# Altium footprint library 2.52-直插元件.PcbLib: 163 footprints (part 4 of 11)
Each footprint in its own frame and in the unit in brackets; x right, y up, seen from the top. Pads: shape width x height; smd on the part's side, far side on the other; paste and mask are expansions set on the pad; w line width, h text height; cw(c..) or ccw(c..) is an arc to the next point about the centre after c.
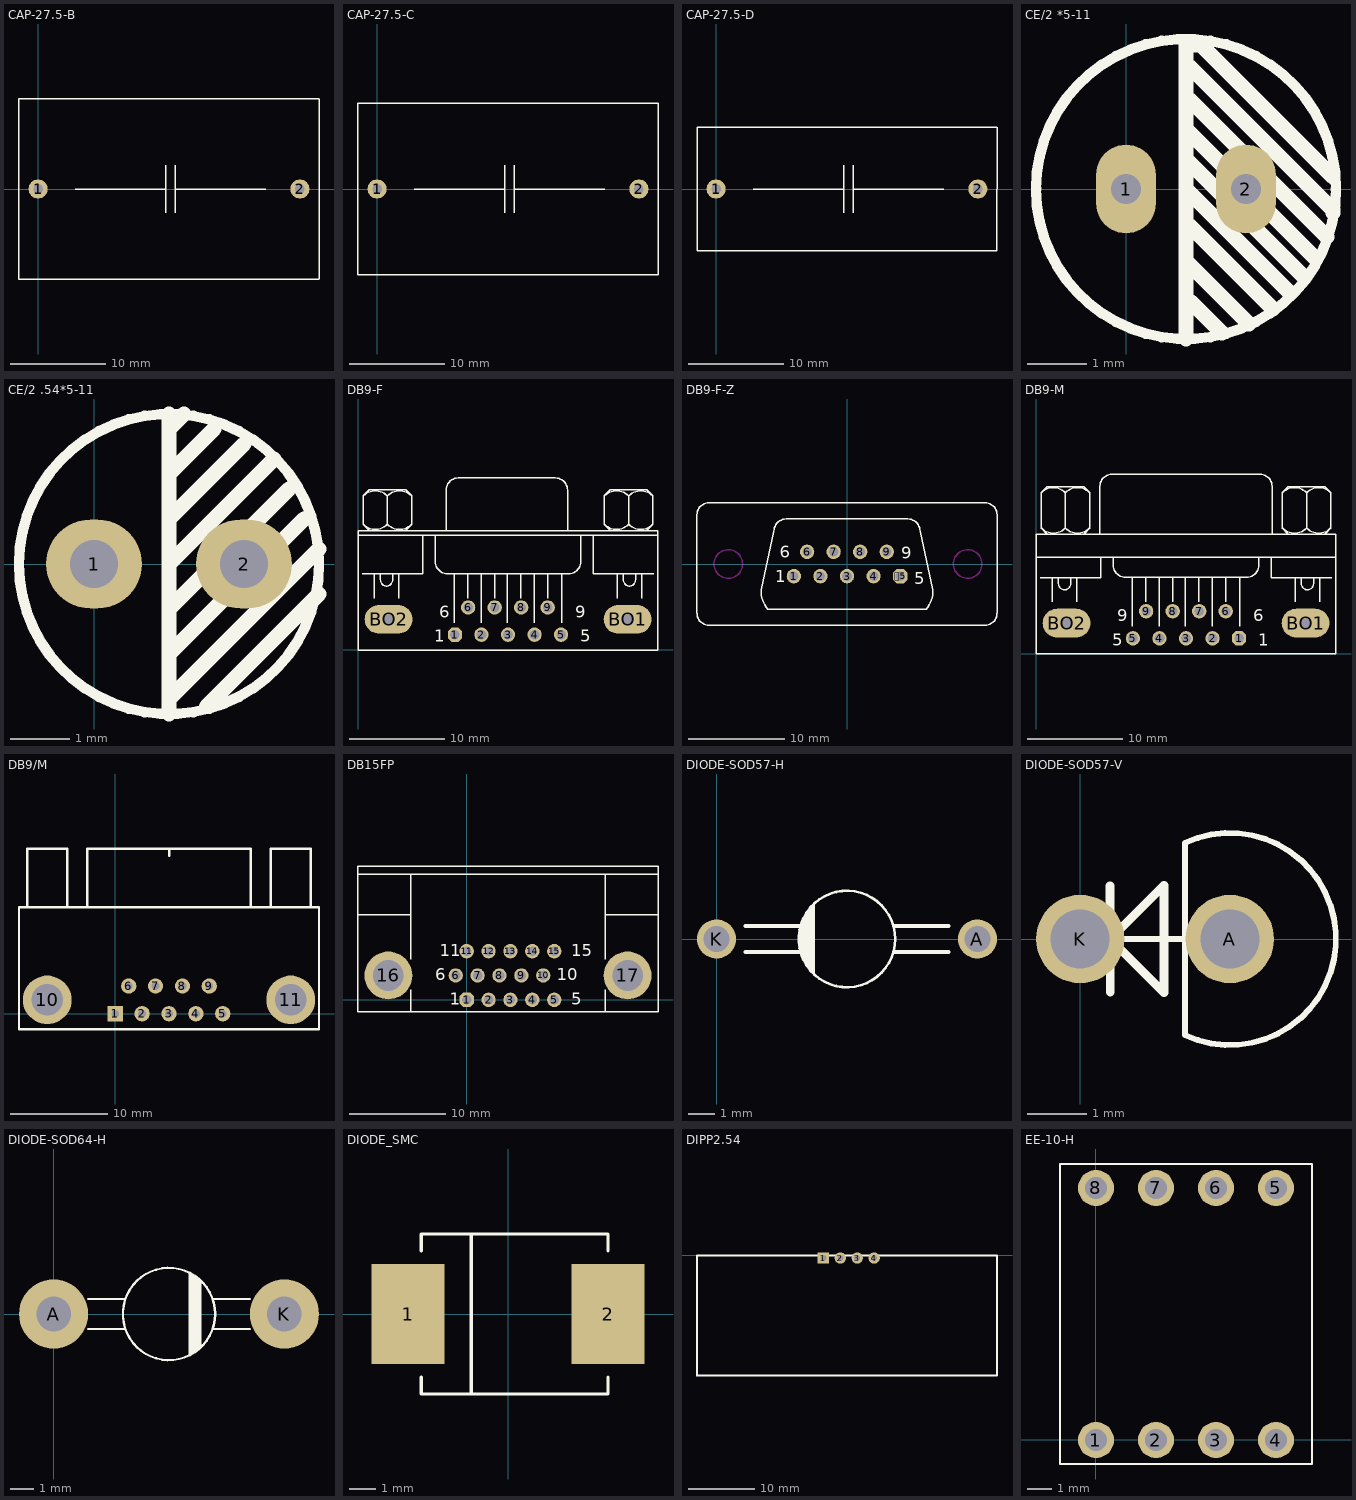
[diagram p3: the footprints below, top view; thin cyan lines are the x and y axes]

## CAP-27.5-B [mm]
pads (2):
  round 2 hole 1: 1(0,0) 2(27.5,0)
Top Overlay:
  lines w0.15: 3.901,0 13.401,0 ; 13.401,-2.5 13.401,2.5 ; 14.401,-2.5 14.401,2.5 ; 14.401,0 23.901,0 ; 29.487,-9.5 -2,-9.5 -2,9.5 29.5,9.5 29.5,-9.5
3D body "User Library-B81131(19_30_31).step": height 30, standoff -1.5, extent -2,-9.5 29.5,9.5

## CAP-27.5-C [mm]
pads (2):
  round 2 hole 1: 1(0,0) 2(27.5,0)
Top Overlay:
  lines w0.15: 3.901,0 13.401,0 ; 13.401,-2.5 13.401,2.5 ; 14.401,-2.5 14.401,2.5 ; 14.401,0 23.901,0 ; -2,-9 -2,9 29.5,9 29.5,-9 -2,-9
3D body "User Library-B32924F3565.step": height 1.5, standoff -33, extent -2,-9 29.5,9

## CAP-27.5-D [mm] "淘宝ID:黄晶宝石   店铺网址:https://shop463601444.taobao.com"
pads (2):
  round 2 hole 1: 1(0,0) 2(27.5,0)
Top Overlay:
  lines w0.15: 3.901,0 13.401,0 ; 13.401,-2.5 13.401,2.5 ; 14.401,-2.5 14.401,2.5 ; 14.401,0 23.901,0 ; 29.5,6.5 -2,6.5 -2,-6.5 29.5,-6.5 29.505,6.5
3D body "CAP-27.5.STEP": height 1.05, standoff -22.45, extent -2,-6.5 29.5,6.5

## CE/2 *5-11 [mil]
pads (2):
  oval 40x59.06 hole 20: 1(0,0) 2(80,0)
Top Overlay:
  circle w7: c40,0 r100
  lines w10: 40,-100 40,96 ; 40,0 109,-69 ; 40,20 118,-58 ; 40,40 126,-46 ; 41,-49 82,-90 ; 42,-24 98,-80 ; 42,60 134,-32 ; 42,82 138,-14 138,-16 ; 43,-75 64,-96 ; 44,96 50,96 138,8
3D body "SW3DPS-ELECTROLITIC CAPACITOR RADIAL 5X11-DEFAULT.STEP": height 433.07, standoff -98.43, extent -58,-98 138.85,98.85

## CE/2 .54*5-11 [mil]
pads (2):
  oval 64x59.06 hole 32: 1(0,0) 2(100,0)
Top Overlay:
  circle w7: c50,0 r100
  lines w10: 50,-100 50,100 ; 50,-90 150,10 ; 50,-60 140,30 ; 50,-30 130,50 ; 50,0 120,70 ; 50,30 100,80 ; 50,60 80,90 ; 50,90 60,100 ; 75,-95 150,-20
3D body "SW3DPS-ELECTROLITIC CAPACITOR RADIAL 5X11-DEFAULT.STEP": height 433.07, standoff -98.43, extent -48,-98 148.85,98.85

## DB9-F [mm]
pads (11):
  oct 1.5x1.5 hole 1: 1(10.092,1.6)
  round 1.5 hole 1: 2(12.865,1.6) 3(15.638,1.6) 4(18.411,1.6) 5(21.184,1.6) 6(11.468,4.44) 7(14.241,4.44) 8(17.014,4.44) 9(19.787,4.44)
  oval 5x3 hole 1: BO1(28.147,3.2) BO2(3.15,3.2)
Top Overlay:
  lines w0.15: -0.025,11.975 31.301,11.975 ; 0.398,7.95 6.748,7.95 6.748,11.975 ; 0.48,13.138 ccw(c1.753,14.41) 3.025,13.138 ; 0.48,16.106 cw(c1.753,14.834) 3.025,16.106 ; 1.118,12.505 0.483,13.14 0.483,16.104 1.118,16.739 4.928,16.739 5.563,16.104 ; 1.668,5.41 1.668,7.95 ; 2.303,7.95 2.303,7.315 ccw(c2.938,7.315) 3.573,7.315 3.573,7.95 ; 3.018,16.1 3.023,13.14 ; 3.02,13.138 ccw(c4.293,14.41) 5.565,13.138 ; 3.02,16.106 cw(c4.293,14.834) 5.565,16.106 5.563,13.14 4.928,12.505 ; 4.208,5.41 4.208,7.95 ; 8.018,9.271 8.018,11.975 ; 8.043,9.246 ccw(c9.313,9.246) 9.313,7.976 ; 9.161,12.497 9.161,16.764 ; 9.161,16.713 cw(c10.431,16.713) 10.431,17.983 ; 9.288,7.975 21.988,7.975 ; 10.033,2.87 10.033,7.975 ; 10.431,18 20.591,18 ; 11.438,5.41 11.438,7.975 ; 12.835,2.87 12.835,7.975 ; 14.241,5.41 14.241,7.975 ; 15.562,2.87 15.562,7.975 ; 16.993,5.41 16.993,7.975 ; 18.39,2.87 18.39,7.975 ; 19.77,5.41 19.77,7.975 ; 20.591,17.983 cw(c20.591,16.713) 21.861,16.713 ; 21.243,2.87 21.243,7.975 ; 21.861,12.497 21.861,16.764 ; 21.988,7.976 ccw(c21.988,9.246) 23.258,9.246 ; 23.258,9.22 23.258,11.975 ; 24.528,11.975 24.528,7.95 30.878,7.95 ; 25.711,13.138 ccw(c26.983,14.41) 28.255,13.138 ; 25.713,16.104 26.348,16.739 30.158,16.739 30.793,16.104 30.793,13.14 30.158,12.505 ; 26.348,12.505 25.713,13.14 25.711,16.106 cw(c26.983,14.834) 28.255,16.106 ; 27.068,5.41 27.068,7.95 ; 27.703,7.95 27.703,7.315 ccw(c28.338,7.315) 28.973,7.315 28.973,7.95 ; 28.251,13.138 ccw(c29.523,14.41) 30.795,13.138 ; 28.251,16.106 cw(c29.523,14.834) 30.795,16.106 ; 28.253,13.14 28.258,16.1 ; 29.608,5.41 29.608,7.95 ; -0.025,-0.025 -0.025,12.475 31.301,12.475 31.301,-0.025 -0.025,-0.025
  text "9" at 22.665,3.378 h1.27
  text "5" at 23.173,0.838 h1.27
  text "1" at 7.933,0.838 h1.27
  text "6" at 8.441,3.378 h1.27
Keep-Out Layer:
  lines w1: 1.65,3.2 4.65,3.2 ; 26.647,3.2 29.647,3.2
3D body "User Library-DRB-9FA.STEP": height 12.6, standoff -4, extent 0.238,0.03 31.038,17.93

## DB9-F-Z [mm]
pads (9):
  round 1.5 hole 1: 1(-5.546,-1.27) 2(-2.773,-1.27) 3(0,-1.27) 4(2.773,-1.27) 6(-4.17,1.27) 7(-1.397,1.27) 8(1.376,1.27) 9(4.149,1.27)
  oct 1.5x1.5 hole 1: 5(5.546,-1.27)
Top Overlay:
  lines w0.15: -15.663,-5.13 ccw(c-14.393,-5.13) -14.393,-6.4 14.393,-6.4 ccw(c14.393,-5.13) 15.663,-5.13 15.663,5.13 ccw(c14.393,5.13) 14.393,6.4 -14.393,6.4 ccw(c-14.393,5.13) -15.663,5.13 -15.663,-5.13 ; -8.953,-3.003 ccw(c-6.553,-3.003) -8.25,-4.7 8.25,-4.7 ccw(c6.553,-3.003) 8.953,-3.003 8.953,-2.694 7.623,3.43 ccw(c6.353,3.43) 6.353,4.7 6.25,4.7 -6.25,4.7 -6.353,4.7 ccw(c-6.353,3.43) -7.623,3.43 -8.953,-2.694 -8.953,-3.003
  text "6" at -7.045,0.627 h1.27
  text "1" at -7.506,-1.908 h1.27
  text "5" at 7.009,-2.115 h1.27
  text "9" at 5.649,0.558 h1.27
Keep-Out Layer:
  circle w0.15: c12.596,0 r1.5
  circle w0.15: c-12.402,0 r1.5
3D body "User Library-con-116-1.step": height 12.8, standoff -4.1, extent -15.499,-6.2 15.499,6.2

## DB9-M [mm]
pads (11):
  oct 1.5x1.5 hole 1: 1(21.209,1.626)
  round 1.5 hole 1: 2(18.436,1.626) 3(15.663,1.626) 4(12.89,1.626) 5(10.118,1.626) 6(19.812,4.466) 7(17.039,4.466) 8(14.266,4.466) 9(11.493,4.466)
  oval 5x3 hole 1: BO1(28.173,3.225) BO2(3.175,3.225)
Top Overlay:
  lines w0.15: 0,10.1 31.327,10.1 ; 0.423,7.976 6.773,7.976 6.773,10.1 ; 0.506,13.163 ccw(c1.778,14.436) 3.05,13.163 ; 0.506,16.867 cw(c1.778,15.595) 3.05,16.867 ; 1.143,12.531 0.508,13.166 0.508,16.865 1.143,17.5 4.953,17.5 5.588,16.865 ; 1.693,5.436 1.693,7.976 ; 2.328,7.976 2.328,7.341 ccw(c2.963,7.341) 3.598,7.341 3.598,7.976 ; 3.043,16.867 3.048,13.166 ; 3.046,13.163 ccw(c4.318,14.436) 5.59,13.163 ; 3.046,16.867 cw(c4.318,15.595) 5.59,16.867 ; 4.233,5.436 4.233,7.976 ; 4.953,12.531 5.588,13.166 5.591,16.865 ; 6.663,12.5 6.663,17.53 cw(c7.933,17.53) 7.933,18.8 23.393,18.8 cw(c23.393,17.53) 24.663,17.53 24.663,12.5 ; 8.043,9.296 8.043,10.1 ; 8.069,9.271 ccw(c9.339,9.271) 9.339,8.001 ; 9.313,8 22.013,8 ; 10.058,2.896 10.058,8 ; 11.464,5.436 11.464,8 ; 12.861,2.896 12.861,8 ; 14.266,5.436 14.266,8 ; 15.587,2.896 15.587,8 ; 17.018,5.436 17.018,8 ; 18.415,2.896 18.415,8 ; 19.795,5.436 19.795,8 ; 21.268,2.896 21.268,8 ; 22.013,8.001 ccw(c22.013,9.271) 23.283,9.271 ; 23.283,9.246 23.283,10.1 ; 24.553,10.1 24.553,7.976 30.903,7.976 ; 25.736,16.865 25.739,13.166 26.374,12.531 ; 25.736,13.163 ccw(c27.009,14.436) 28.281,13.163 ; 25.736,16.867 cw(c27.009,15.595) 28.281,16.867 ; 25.739,16.865 26.374,17.5 30.184,17.5 30.819,16.865 30.819,13.166 30.184,12.531 ; 27.093,5.436 27.093,7.976 ; 27.728,7.976 27.728,7.341 ccw(c28.363,7.341) 28.998,7.341 28.998,7.976 ; 28.276,13.163 ccw(c29.549,14.436) 30.821,13.163 ; 28.276,16.867 cw(c29.549,15.595) 30.821,16.867 ; 28.279,13.166 28.284,16.867 ; 29.633,5.436 29.633,7.976 ; 0,0 31.327,0 31.327,12.5 0,12.5 0,0
  text "9" at 8.467,3.404 h1.27
  text "5" at 7.959,0.864 h1.27
  text "1" at 23.199,0.864 h1.27
  text "6" at 22.691,3.404 h1.27
Keep-Out Layer:
  lines w1: 1.675,3.225 4.675,3.225 ; 26.673,3.225 29.673,3.225
3D body "User Library-DRB-9MB.STEP": height 12.6, standoff -4, extent 0.231,-0.004 31.031,20.496

## DB9/M [mm]
pads (11):
  rect 1.575x1.575 hole 0.8: 1(0,0)
  round 1.575 hole 0.8: 2(2.76,0) 3(5.52,0) 4(8.28,0) 5(11.04,0) 6(1.38,2.84) 7(4.14,2.84) 8(6.9,2.84) 9(9.66,2.84)
  round 5 hole 3.25: 10(-6.98,1.42) 11(18.02,1.42)
Top Overlay:
  lines w0.254: -9.05,10.92 -9.05,16.92 -4.94,16.92 ; -4.91,10.92 -4.91,16.92 ; -2.85,10.92 -2.85,16.92 13.9,16.92 13.9,10.92 ; 5.525,16.2 5.525,16.9 ; 15.95,10.92 15.95,16.92 20.06,16.92 ; 20.09,10.92 20.09,16.92 ; -9.88,-1.58 20.92,-1.58 20.92,10.92 -9.88,10.92 -9.88,-1.58
3D body "SW3dPS-9-PIN_DSUB-1.STEP": height 12.81, standoff -2.91, extent -9.925,-2.012 20.885,17.063

## DB15FP [mm]
pads (17):
  oct 1.5x1.5 hole 1: 1(0.005,0.007)
  round 1.5 hole 1: 2(2.291,0.007) 3(4.577,0.007) 4(6.863,0.007) 5(9.149,0.007) 6(-1.138,2.547) 7(1.148,2.547) 8(3.434,2.547) 9(5.72,2.547) 10(8.006,2.547) 11(0.005,5.087) 12(2.291,5.087) 13(4.577,5.087) 14(6.863,5.087) 15(9.149,5.087)
  round 5 hole 3.2: 16(-8.165,2.547) 17(16.812,2.547)
Top Overlay:
  lines w0.15: -11.34,8.897 -5.837,8.897 ; -11.34,13.13 19.987,13.13 ; -5.837,-1.263 -5.837,1.065 ; -5.837,4.24 -5.837,8.897 ; -5.837,13.13 -5.837,8.897 ; 14.483,-1.263 14.483,1.065 ; 14.483,4.24 14.483,8.897 ; 14.483,13.13 14.483,8.897 ; 19.987,8.897 14.483,8.897 ; -11.34,-1.263 19.987,-1.263 19.987,13.977 -11.34,13.977 -11.34,-1.263
  text "1" at -1.773,-0.501 h1.27
  text "6" at -3.297,2.039 h1.27
  text "11" at -2.789,4.579 h1.27
  text "15" at 10.927,4.579 h1.27
  text "10" at 9.403,2.039 h1.27
  text "5" at 10.927,-0.501 h1.27
3D body "User Library-Connector, D-Sub, 15 pin HD, RA, Receptacle.step": height 12.27, standoff -3.77, extent -11.082,-0.854 19.728,20.246

## DIODE-SOD57-H [mm]
pads (2):
  round 1.5 hole 1: A(10,0) K(0,0)
Top Overlay:
  circle w0.1: c4.997,0 r1.85
  region: 3.715,1.322 3.678,1.285 3.551,1.158 3.353,0.861 3.216,0.531 3.146,0.18 3.146,0.001 3.146,-0.178 3.216,-0.529 3.353,-0.859 3.551,-1.156 3.678,-1.283 3.715,-1.32
  lines w0.1: 3.715,-1.32 3.715,1.322
  lines w0.15: 1.113,-0.5 3.202,-0.5 ; 1.113,0.5 3.202,0.5 ; 6.798,-0.5 8.887,-0.5 ; 6.798,0.5 8.887,0.5
3D body "User Library-SOD57.STEP": height 3.88, standoff -1.4, extent -0.483,-1.876 10.477,1.876

## DIODE-SOD57-V [mm]
pads (2):
  round 1.5 hole 1: A(2.54,0) K(0,0)
Top Overlay:
  lines w0.1: 0,0 2.54,0 ; 1.779,1.616 1.779,-1.631 ccw(c2.54,0) 1.779,1.631
  lines w0.15: 0.508,0 0.508,0.903 ; 0.509,-0.903 0.509,0 ; 0.509,0 1.421,0.912 1.421,-0.912 0.509,0
3D body "User Library-SOD57(V).STEP": height 7.92, standoff -1.75, extent -0.438,-1.876 4.378,1.876

## DIODE-SOD64-H [mm]
pads (2):
  round 3 hole 1.5: A(0,0) K(10,0)
Top Overlay:
  circle w0.1: c5,0 r2
  lines w0.1: 1.49,0.649 3.1,0.649 ; 1.503,-0.653 3.112,-0.653 ; 5.891,1.77 5.891,-1.779 5.898,-1.786 ; 5.961,-1.723 5.973,-1.711 5.973,1.707 ; 6.055,-1.686 6.061,-1.68 6.061,1.65 ; 6.136,-1.604 6.155,-1.585 6.155,1.594 ; 6.237,-1.541 6.243,-1.535 6.243,1.525 ; 6.294,1.468 6.294,-1.516 6.3,-1.522 ; 6.35,1.456 6.35,-1.447 6.363,-1.46 ; 6.888,-0.653 8.497,-0.653 ; 6.9,0.649 8.51,0.649
3D body "User Library-BYV28-200.STEP": height 4.75, standoff -2.5, extent -0.675,-2.25 10.675,2.25

## DIODE_SMC [mil] "Magnetic-Core Inductor with Winding Polarity Marking; 2 Leads"
pads (2):
  rect 110x150 smd: 1(-150,0) 2(150,0)
Top Overlay:
  lines w5: -130,-95 -130,-120 150,-120 150,-95 ; -130,95 -130,120 150,120 150,95 ; -55,-120 -55,120
Mechanical 1:
  lines w1: -130,-120 150,-120 ; -130,120 150,120

## DIPP2.54 [mm]
pads (4):
  rect 1.7x1.7 hole 0.9: 1(32.131,-0.381)
  round 1.7 hole 0.9: 2(34.671,-0.381) 3(37.211,-0.381) 4(39.751,-0.381)
Top Overlay:
  lines w0.3: 13.187,-18 13.187,0 58.145,0 58.166,-0.021 58.166,-18.021 13.208,-18.021 13.187,-18
3D body "User Library-HC-SR04.STEP": height 20.5, standoff -4.68, extent 13.187,-18.068 58.187,0

## EE-10-H [mm] "淘宝ID:黄晶宝石   店铺网址:https://shop463601444.taobao.com"
pads (8):
  round 1.5 hole 0.9: 1(0,0) 2(2.5,0) 3(5,0) 4(7.5,0) 5(7.5,10.5) 6(5,10.5) 7(2.5,10.5) 8(0,10.5)
Top Overlay:
  lines w0.1: -1.5,-1 -1.5,11.5 9,11.5 9,-1 -1.5,-1
3D body "EE1-H.STEP": height 10.7, standoff -3.8, extent -1.66,-1 9.16,11.5